# Altium integrated library Cap-Cer-SMD_V2.IntLib: 957 symbols (part 6 of 7)
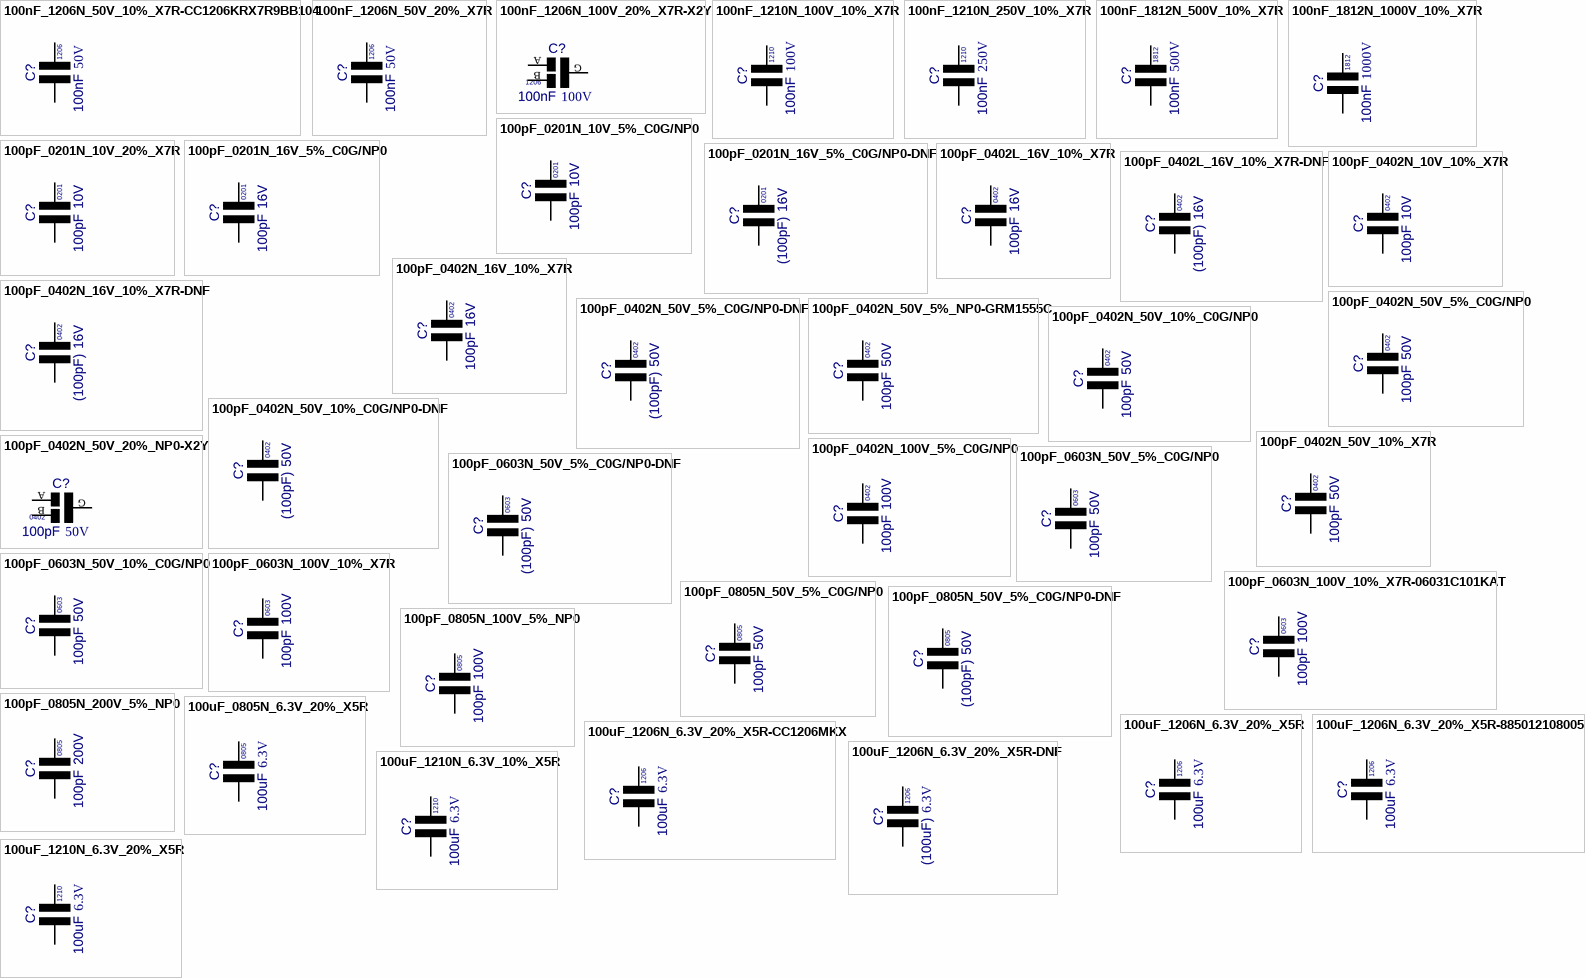
[diagram p28: symbols 100nF_1206N_50V_10%_X7R-CC1206KRX7R9BB104 to 100uF_1210N_6.3V_20%_X5R]

## 100pF_0603N_50V_5%_C0G/NP0-DNF
designator C?, comment value (100pF)  Voltage: 50V  Text1: 0603  (hidden comment: 100pF_C0603_50V_5%_C0G/NP0-DNF)
Cap Ceramic C0G/NP0 - Do not Fit; Manufacturer: Various; Part Number: DNF - 100pF 0603 50V 5% C0G/NP0; Tol: 5%; Package: CAPC0603X85N; EDM-PN: *; Text2: *; SAAB PN: *; DCE Part No: *
footprint CAPC0603X85N (Chip Capacitor, 0603, 2-Leads, Body 1.6x0.8mm, IPC Medium Density)
pins: 1, 2

## 100pF_0603N_50V_10%_C0G/NP0
designator C?, comment value 100pF  Voltage: 50V  Text1: 0603  (hidden comment: 100pF_C0603_50V_10%_C0G/NP0)
Cap Ceramic C0G/NP0; Manufacturer: Various; Part Number: 100pF 0603 50V 10% C0G/NP0; Tol: 10%; Reutech PN: 5910-CA-0418; Package: CAPC0603X85N; EDM-PN: *; Text2: *; SAAB PN: *; DCE Part No: *
footprint CAPC0603X85N (Chip Capacitor, 0603, 2-Leads, Body 1.6x0.8mm, IPC Medium Density)
pins: 1, 2

## 100pF_0603N_100V_10%_X7R
designator C?  value 100pF  Voltage: 100V  Text1: 0603  (hidden comment: 100pF_0603N_100V_10%_X7R)
Cap Ceramic X7R; Manufacturer: Various; Part Number: 100pF 0603 100V 10% X7R; Tol: 10%; Package: CAPC0603X85N; EDM-PN: *; Text2: *; Reutech PN: *; SAAB PN: *; DCE Part No: *
footprint CAPC0603X85N (Chip Capacitor, 0603, 2-Leads, Body 1.6x0.8mm, IPC Medium Density)
pins: 1, 2

## 100pF_0603N_100V_10%_X7R-06031C101KAT
designator C?, comment value 100pF  Voltage: 100V  Text1: 0603  (hidden comment: 06031C101KAT)
Cap Ceramic X7R; Manufacturer: AVX; Tol: 10%; Part Number: 06031C101KAT; Package: CAPC0603X85N; EDM-PN: *; Text2: *; Reutech PN: *; SAAB PN: *; DCE Part No: *
footprint CAPC0603X85N (Chip Capacitor, 0603, 2-Leads, Body 1.6x0.8mm, IPC Medium Density)
pins: 1, 2

## 100pF_0805N_50V_5%_C0G/NP0
designator C?, comment value 100pF  Voltage: 50V  Text1: 0805  (hidden comment: 100pF_C0805_50V_5%_C0G/NP0)
Cap Ceramic C0G/NP0; Manufacturer: Various; Part Number: 100pF 0805 50V 5% C0G/NP0; Tol: 5%; Package: CAPC0805X110N; EDM-PN: *; Text2: *; SAAB PN: *; DCE Part No: *
footprint CAPC0805X110N (Chip Capacitor, 0805, 2-Leads, Body 2.0x1.3mm, IPC Medium Density)
pins: 1, 2

## 100pF_0805N_50V_5%_C0G/NP0-DNF
designator C?, comment value (100pF)  Voltage: 50V  Text1: 0805  (hidden comment: 100pF_C0805_50V_5%_C0G/NP0)
Cap Ceramic C0G/NP0 - Do not Fit; Manufacturer: Various; Part Number: DNF - 100pF 0805 50V 5% C0G/NP0; Tol: 5%; Package: CAPC0805X110N; EDM-PN: *; Text2: *; SAAB PN: *; DCE Part No: *
footprint CAPC0805X110N (Chip Capacitor, 0805, 2-Leads, Body 2.0x1.3mm, IPC Medium Density)
pins: 1, 2

## 100pF_0805N_100V_5%_NP0
designator C?, comment value 100pF  Voltage: 100V  Text1: 0805  (hidden comment: 100pF_C0805_100V_5%_NP0)
Cap Ceramic NP0; Manufacturer: Various; Part Number: 100pF 0805 100V 5% NP0; Tol: 5%; Reutech PN: 5910-CA-0161; Package: CAPC0805X110N; EDM-PN: *; Text2: *; SAAB PN: *; DCE Part No: *
footprint CAPC0805X110N (Chip Capacitor, 0805, 2-Leads, Body 2.0x1.3mm, IPC Medium Density)
pins: 1, 2

## 100pF_0805N_200V_5%_NP0
designator C?, comment value 100pF  Voltage: 200V  Text1: 0805  (hidden comment: 100pF_C0805_200V_5%_NP0)
Cap Ceramic NP0; Manufacturer: Various; Part Number: 100pF 0805 200V 5% C0G/NP0; Tol: 5%; Package: CAPC0805X110N; EDM-PN: *; Text2: *; SAAB PN: *; DCE Part No: *
footprint CAPC0805X110N (Chip Capacitor, 0805, 2-Leads, Body 2.0x1.3mm, IPC Medium Density)
pins: 1, 2

## 100uF_0805N_6.3V_20%_X5R
designator C?, comment value 100uF  Voltage: 6.3V  Text1: 0805  (hidden comment: 100uF_C0805_6.3V_20%_X5R)
Cap Ceramic X5R; Manufacturer: Various; Part Number: 100uF 0805 6.3V 20% X5R; Tol: 20%; Package: CAPC0805X135N; EDM-PN: *; Text2: *; SAAB PN: *; DCE Part No: *
footprint CAPC0805X135N (Chip Capacitor, 0805, 2-Leads, Body 2.0x1.3mm, IPC Medium Density)
pins: 1, 2

## 100uF_1206N_6.3V_20%_X5R
designator C?, comment value 100uF  Voltage: 6.3V  Text1: 1206  (hidden comment: 100uF_C1206_6.3V_20%_X5R)
Cap Ceramic X5R; Manufacturer: Various; Part Number: 100uF 1206 6.3V 20% X5R; Tol: 20%; Package: CAPC1206X135N; EDM-PN: *; Text2: *; SAAB PN: *; DCE Part No: *
footprint CAPC1206X135N (Chip Capacitor, 1206, 2-Leads, Body 3.2x1.6mm, IPC Medium Density)
pins: 1, 2

## 100uF_1206N_6.3V_20%_X5R-885012108005
designator C?, comment value 100uF  Voltage: 6.3V  Text1: 1206  (hidden comment: 885012108005)
Cap Ceramic X5R; Manufacturer: Wurth; EDM-PN: CAP1493; Tol: 20%; Part Number: 885012108005; Package: CAPC1206X135N; Text2: *; SAAB PN: *; DCE Part No: *
footprint CAPC1206X135N (Chip Capacitor, 1206, 2-Leads, Body 3.2x1.6mm, IPC Medium Density)
pins: 1, 2

## 100uF_1206N_6.3V_20%_X5R-CC1206MKX
designator C?, comment value 100uF  Voltage: 6.3V  Text1: 1206  (hidden comment: CC1206MKX5R5BB107)
Cap Ceramic X5R; Manufacturer: Yageo; EDM-PN: CAP615; Tol: 20%; Part Number: CC1206MKX5R5BB107; Package: CAPC1206X135N; Text2: *; SAAB PN: *; DCE Part No: *
footprint CAPC1206X135N (Chip Capacitor, 1206, 2-Leads, Body 3.2x1.6mm, IPC Medium Density)
pins: 1, 2

## 100uF_1206N_6.3V_20%_X5R-DNF
designator C?, comment value (100uF)  Voltage: 6.3V  Text1: 1206  (hidden comment: 100uF_C1206_6.3V_20%_X5R)
Cap Ceramic X5R - Do not Fit; Manufacturer: Various; Part Number: DNF - 100uF 1206 6.3V 20% X5R; Tol: 20%; Package: CAPC1206X135N; EDM-PN: *; Text2: *; SAAB PN: *; DCE Part No: *
footprint CAPC1206X135N (Chip Capacitor, 1206, 2-Leads, Body 3.2x1.6mm, IPC Medium Density)
pins: 1, 2

## 100uF_1210N_6.3V_10%_X5R
designator C?, comment value 100uF  Voltage: 6.3V  Text1: 1210  (hidden comment: 100uF_C1210_6.3V_10%_X5R)
Cap Ceramic X5R; Manufacturer: Various; Part Number: 100uF 1210 6.3V 10% X5R; Tol: 10%; Package: CAPC1210X135N; EDM-PN: *; Text2: *; SAAB PN: *; DCE Part No: *
footprint CAPC1210X135N (Chip Capacitor, 1210, 2-Leads, Body 3.2x2.5mm, IPC Medium Density)
pins: 1, 2

## 100uF_1210N_6.3V_20%_X5R
designator C?, comment value 100uF  Voltage: 6.3V  Text1: 1210  (hidden comment: 100uF_C1210_6.3V_20%_X5R)
Cap Ceramic X5R; Manufacturer: Various; Part Number: 100uF 1210 6.3V 20% X5R; DCE Part No: 9196; Tol: 20%; Package: CAPC1210X135N; EDM-PN: *; Text2: *; SAAB PN: *
footprint CAPC1210X135N (Chip Capacitor, 1210, 2-Leads, Body 3.2x2.5mm, IPC Medium Density)
pins: 1, 2

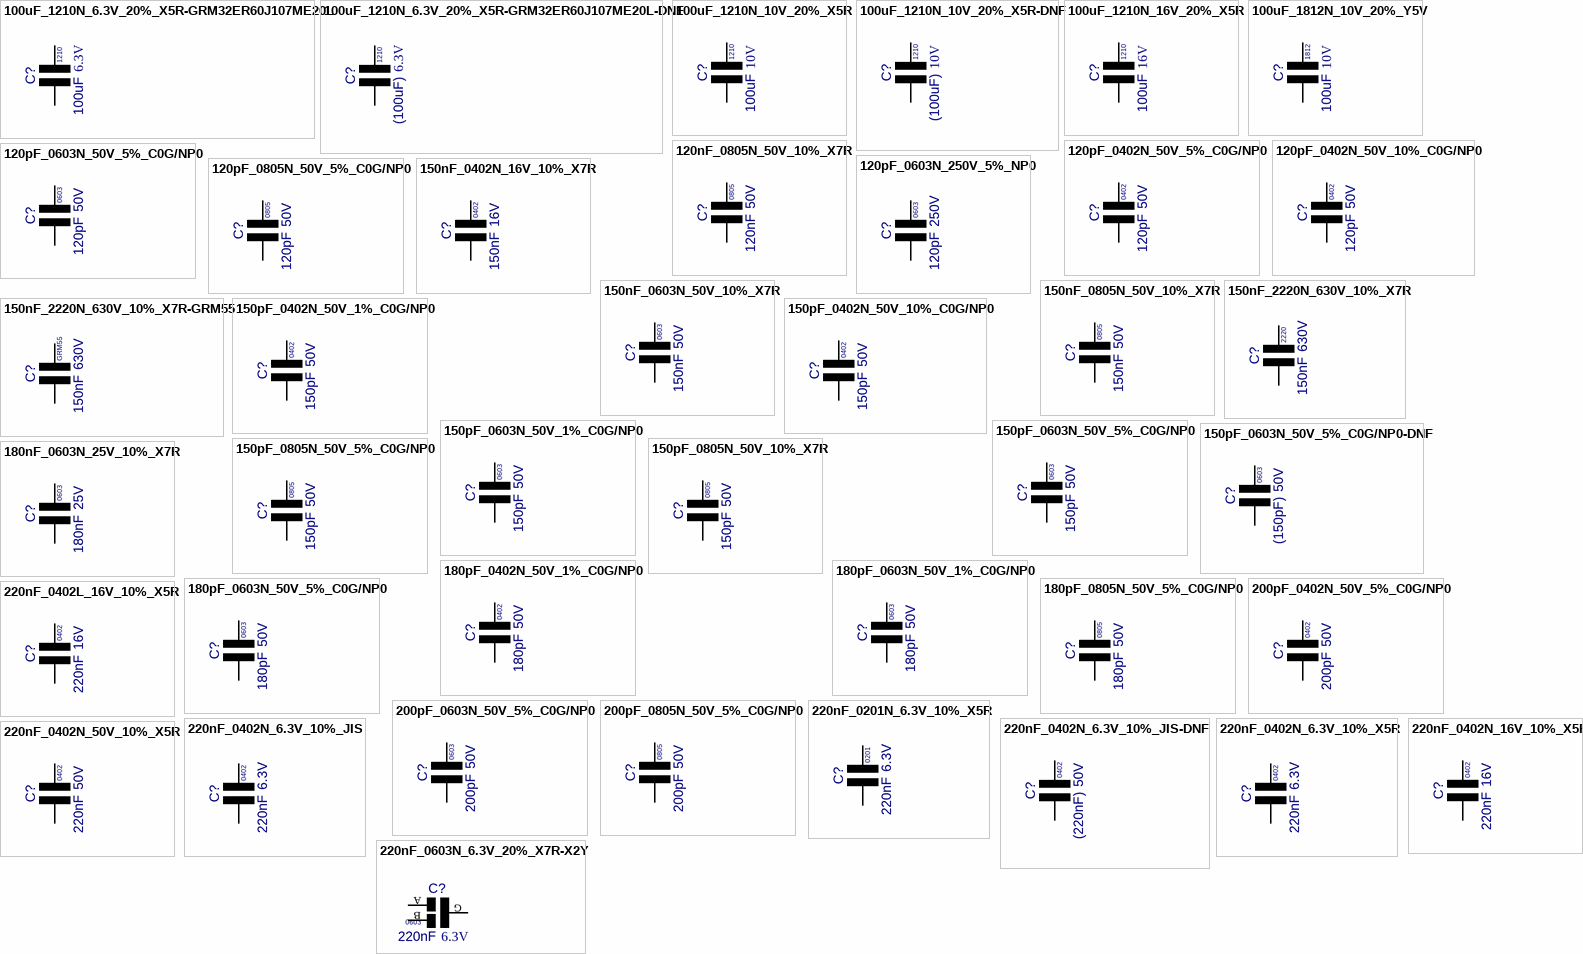
[diagram p19: symbols 100uF_1210N_6.3V_20%_X5R-GRM32ER60J107ME20L to 220nF_0603N_6.3V_20%_X7R-X2Y]

## 100uF_1210N_6.3V_20%_X5R-GRM32ER60J107ME20L
designator C?, comment value 100uF  Voltage: 6.3V  Text1: 1210  (hidden comment: GRM32ER60J107ME20L)
Cap Ceramic X5R; Manufacturer: Murata; Tol: 20%; Part Number: GRM32ER60J107ME20L; Package: CAPC1210X135N; EDM-PN: *; Text2: *; SAAB PN: *; DCE Part No: *
footprint CAPC1210X135N (Chip Capacitor, 1210, 2-Leads, Body 3.2x2.5mm, IPC Medium Density)
pins: 1, 2

## 100uF_1210N_6.3V_20%_X5R-GRM32ER60J107ME20L-DNF
designator C?, comment value (100uF)  Voltage: 6.3V  Text1: 1210  (hidden comment: GRM32ER60J107ME20L)
Cap Ceramic X5R - Do not Fit; Manufacturer: Murata; Part Number: DNF - GRM32ER60J107ME20L; Tol: 20%; Package: CAPC1210X135N; EDM-PN: *; Text2: *; SAAB PN: *; DCE Part No: *
footprint CAPC1210X135N (Chip Capacitor, 1210, 2-Leads, Body 3.2x2.5mm, IPC Medium Density)
pins: 1, 2

## 100uF_1210N_10V_20%_X5R
designator C?, comment value 100uF  Voltage: 10V  Text1: 1210  (hidden comment: 100uF_C1210_10V_20%_X5R)
Cap Ceramic X5R; Manufacturer: Various; Part Number: 100uF 1210 10V 20% X5R; EDM-PN: CAP614; Tol: 20%; Package: CAPC1210X135N; Text2: *; SAAB PN: *; DCE Part No: *
footprint CAPC1210X135N (Chip Capacitor, 1210, 2-Leads, Body 3.2x2.5mm, IPC Medium Density)
pins: 1, 2

## 100uF_1210N_10V_20%_X5R-DNF
designator C?, comment value (100uF)  Voltage: 10V  Text1: 1210  (hidden comment: 100uF_C1210_10V_20%_X5R)
Cap Ceramic X5R - Do not Fit; Manufacturer: Various; Part Number: DNF - 100uF 1210 10V 20% X5R; EDM-PN: CAP614; Tol: 20%; Package: CAPC1210X135N; Text2: *; SAAB PN: *; DCE Part No: *
footprint CAPC1210X135N (Chip Capacitor, 1210, 2-Leads, Body 3.2x2.5mm, IPC Medium Density)
pins: 1, 2

## 100uF_1210N_16V_20%_X5R
designator C?, comment value 100uF  Voltage: 16V  Text1: 1210  (hidden comment: 100uF_C1210_16V_20%_X5R)
Cap Ceramic X5R; Manufacturer: Various; Part Number: 100uF 1210 16V 20% X5R; EDM-PN: CAP676; Tol: 20%; Package: CAPC1210X135N; Text2: *; SAAB PN: *; DCE Part No: *
footprint CAPC1210X135N (Chip Capacitor, 1210, 2-Leads, Body 3.2x2.5mm, IPC Medium Density)
pins: 1, 2

## 100uF_1812N_10V_20%_Y5V
designator C?, comment value 100uF  Voltage: 10V  Text1: 1812  (hidden comment: 100uF_C1812_10V_20%_Y5V)
Cap Ceramic Y5V; Manufacturer: Various; Part Number: 100uF C1812 10V 20% Y5V; Tol: 20%; Package: CAPC1812X135N; EDM-PN: *; Text2: *; SAAB PN: *; DCE Part No: *
footprint CAPC1812X135N (Chip Capacitor, 1812, 2-Leads, Body 4.5x3.2mm, IPC Medium Density)
pins: 1, 2

## 120nF_0805N_50V_10%_X7R
designator C?, comment value 120nF  Voltage: 50V  Text1: 0805  (hidden comment: 120nF_C0805_50V_10%_X7R)
Cap Ceramic X7R; Manufacturer: Various; Part Number: 120nF 0805 50V 10% X7R; Tol: 10%; Package: CAPC0805X110N; EDM-PN: *; Text2: *; SAAB PN: *; DCE Part No: *
footprint CAPC0805X110N (Chip Capacitor, 0805, 2-Leads, Body 2.0x1.3mm, IPC Medium Density)
pins: 1, 2

## 120pF_0402N_50V_5%_C0G/NP0
designator C?, comment value 120pF  Voltage: 50V  Text1: 0402  (hidden comment: 120pF_C0402_50V_5%_C0G/NP0)
Cap Ceramic C0G/NP0; Manufacturer: Various; Part Number: 120pF 0402 50V 5% C0G/NP0; Tol: 5%; Package: CAPC0402X60N; EDM-PN: *; Text2: *; SAAB PN: *; DCE Part No: *
footprint CAPC0402X60N (Chip Capacitor, 0402, 2-Leads, Body 1.0x0.5mm, IPC Medium Density)
pins: 1, 2

## 120pF_0402N_50V_10%_C0G/NP0
designator C?, comment value 120pF  Voltage: 50V  Text1: 0402  (hidden comment: 120pF_C0402_50V_10%_C0G/NP0)
Cap Ceramic C0G/NP0; Manufacturer: Various; Part Number: 120pF 0402 50V 10% C0G/NP0; EDM-PN: CAP1330; Tol: 10%; Package: CAPC0402X60N; Text2: *; SAAB PN: *; DCE Part No: *
footprint CAPC0402X60N (Chip Capacitor, 0402, 2-Leads, Body 1.0x0.5mm, IPC Medium Density)
pins: 1, 2

## 120pF_0603N_50V_5%_C0G/NP0
designator C?, comment value 120pF  Voltage: 50V  Text1: 0603  (hidden comment: 120pF_C0603_50V_5%_C0G/NP0)
Cap Ceramic NP0; Manufacturer: Various; Part Number: 120pF 0603 50V 5% C0G/NP0; EDM-PN: CAP596; Tol: 5%; Package: CAPC0603X85N; Text2: *; SAAB PN: *; DCE Part No: *
footprint CAPC0603X85N (Chip Capacitor, 0603, 2-Leads, Body 1.6x0.8mm, IPC Medium Density)
pins: 1, 2

## 120pF_0603N_250V_5%_NP0
designator C?, comment value 120pF  Voltage: 250V  Text1: 0603  (hidden comment: 120pF_C0603_250V_5%_NP0)
Cap Ceramic NP0; Manufacturer: Various; Part Number: 120pF 0603 50V 5% C0G/NP0; Tol: 5%; Package: CAPC0603X85N; EDM-PN: *; Text2: *; SAAB PN: *; DCE Part No: *
footprint CAPC0603X85N (Chip Capacitor, 0603, 2-Leads, Body 1.6x0.8mm, IPC Medium Density)
pins: 1, 2

## 120pF_0805N_50V_5%_C0G/NP0
designator C?, comment value 120pF  Voltage: 50V  Text1: 0805  (hidden comment: 120pF_C0805_50V_5%_C0G/NP0)
Cap Ceramic C0G/NP0; Manufacturer: Various; Part Number: 120pF 0805 50V 5% C0G/NP0; Tol: 5%; Package: CAPC0805X110N; EDM-PN: *; Text2: *; SAAB PN: *; DCE Part No: *
footprint CAPC0805X110N (Chip Capacitor, 0805, 2-Leads, Body 2.0x1.3mm, IPC Medium Density)
pins: 1, 2

## 150nF_0402N_16V_10%_X7R
designator C?, comment value 150nF  Voltage: 16V  Text1: 0402  (hidden comment: 150nF_C0402_16V_10%_X7R)
Cap Ceramic X7R; Manufacturer: Various; Part Number: 150nF 0402 16V 10% X7R; EDM-PN: CAP1034; Tol: 10%; Package: CAPC0402X60N; Text2: *; Reutech PN: *; SAAB PN: *; DCE Part No: *
footprint CAPC0402X60N (Chip Capacitor, 0402, 2-Leads, Body 1.0x0.5mm, IPC Medium Density)
pins: 1, 2

## 150nF_0603N_50V_10%_X7R
designator C?, comment value 150nF  Voltage: 50V  Text1: 0603  (hidden comment: 150nF_C0603_50V_10%_X7R)
Cap Ceramic X7R; Manufacturer: Various; Part Number: 150nF 0603 50V 10% X7R; Tol: 10%; Package: CAPC0603X85N; EDM-PN: *; Text2: *; SAAB PN: *; DCE Part No: *
footprint CAPC0603X85N (Chip Capacitor, 0603, 2-Leads, Body 1.6x0.8mm, IPC Medium Density)
pins: 1, 2

## 150nF_0805N_50V_10%_X7R
designator C?, comment value 150nF  Voltage: 50V  Text1: 0805  (hidden comment: 150nF_C0805_50V_10%_X7R)
Cap Ceramic X7R; Manufacturer: Various; Part Number: 150nF 0805 50V 10% X7R; Tol: 10%; Package: CAPC0805X110N; EDM-PN: *; Text2: *; SAAB PN: *; DCE Part No: *
footprint CAPC0805X110N (Chip Capacitor, 0805, 2-Leads, Body 2.0x1.3mm, IPC Medium Density)
pins: 1, 2

## 150nF_2220N_630V_10%_X7R
designator C?, comment value 150nF  Voltage: 630V  Text1: 2220  (hidden comment: 150nF_C2220_630V_10%_X7R)
Cap Ceramic X7R; Manufacturer: Various; Part Number: 150nF 0805 50V 10% X7R; Tol: 10%; Package: C2220; EDM-PN: *; Text2: *; SAAB PN: *; DCE Part No: *
footprint CAPC2220x220 (Chip Capacitor, 2220, 2-Leads, Body 5.6x5.0mm)
pins: 1, 2

## 150nF_2220N_630V_10%_X7R-GRM55
designator C?, comment value 150nF  Voltage: 630V  Text1: GRM55  (hidden comment: GRM55DR72J154KW01L)
Cap Ceramic X7R; Manufacturer: Murata; Tol: 10%; Part Number: GRM55DR72J154KW01L; Package: C2220; EDM-PN: *; Text2: *; SAAB PN: *; DCE Part No: *
footprint CAPC2220x220 (Chip Capacitor, 2220, 2-Leads, Body 5.6x5.0mm)
pins: 1, 2

## 150pF_0402N_50V_1%_C0G/NP0
designator C?, comment value 150pF  Voltage: 50V  Text1: 0402  (hidden comment: 150pF_C0402_50V_1%_C0G/NP0)
Cap Ceramic C0G/NP0; Manufacturer: Various; Part Number: 150pF 0402 50V 1% C0G/NP0; Tol: 1%; Package: CAPC0402X60N; EDM-PN: *; Text2: *; SAAB PN: *; DCE Part No: *
footprint CAPC0402X60N (Chip Capacitor, 0402, 2-Leads, Body 1.0x0.5mm, IPC Medium Density)
pins: 1, 2

## 150pF_0402N_50V_10%_C0G/NP0
designator C?, comment value 150pF  Voltage: 50V  Text1: 0402  (hidden comment: 150pF_C0402_50V_10%_C0G/NP0)
Cap Ceramic C0G/NP0; Manufacturer: Various; Part Number: 150pF 0402 50V 10% C0G/NP0; DCE Part No: 7136; Tol: 10%; Package: CAPC0402X60N; EDM-PN: *; Text2: *; SAAB PN: *
footprint CAPC0402X60N (Chip Capacitor, 0402, 2-Leads, Body 1.0x0.5mm, IPC Medium Density)
pins: 1, 2

## 150pF_0603N_50V_1%_C0G/NP0
designator C?, comment value 150pF  Voltage: 50V  Text1: 0603  (hidden comment: 150pF_C0603_50V_1%_C0G/NP0)
Cap Ceramic C0G/NP0; Manufacturer: Various; Part Number: 150pF 0603 50V 1% C0G/NP0; EDM-PN: CAP683; Tol: 1%; Package: CAPC0603X85N; Text2: *; SAAB PN: *; DCE Part No: *
footprint CAPC0603X85N (Chip Capacitor, 0603, 2-Leads, Body 1.6x0.8mm, IPC Medium Density)
pins: 1, 2

## 150pF_0603N_50V_5%_C0G/NP0
designator C?, comment value 150pF  Voltage: 50V  Text1: 0603  (hidden comment: 150pF_C0603_50V_5%_C0G/NP0)
Cap Ceramic C0G/NP0; Manufacturer: Various; Part Number: 150pF 0603 50V 5% C0G/NP0; Tol: 5%; Package: CAPC0603X85N; EDM-PN: *; Text2: *; SAAB PN: *; DCE Part No: *
footprint CAPC0603X85N (Chip Capacitor, 0603, 2-Leads, Body 1.6x0.8mm, IPC Medium Density)
pins: 1, 2

## 150pF_0603N_50V_5%_C0G/NP0-DNF
designator C?, comment value (150pF)  Voltage: 50V  Text1: 0603  (hidden comment: 150pF_C0603_50V_5%_C0G/NP0)
Cap Ceramic C0G/NP0 - Do not Fit; Manufacturer: Various; Part Number: DNF - 150pF 0603 50V 5% C0G/NP0; Tol: 5%; Package: CAPC0603X85N; EDM-PN: *; Text2: *; SAAB PN: *; DCE Part No: *
footprint CAPC0603X85N (Chip Capacitor, 0603, 2-Leads, Body 1.6x0.8mm, IPC Medium Density)
pins: 1, 2

## 150pF_0805N_50V_5%_C0G/NP0
designator C?, comment value 150pF  Voltage: 50V  Text1: 0805  (hidden comment: 150pF_C0805_50V_5%_C0G/NP0)
Cap Ceramic C0G/NP0; Manufacturer: Various; Part Number: 150pF 0805 50V 5% C0G/NP0; Tol: 5%; Package: CAPC0805X110N; EDM-PN: *; Text2: *; SAAB PN: *; DCE Part No: *
footprint CAPC0805X110N (Chip Capacitor, 0805, 2-Leads, Body 2.0x1.3mm, IPC Medium Density)
pins: 1, 2

## 150pF_0805N_50V_10%_X7R
designator C?, comment value 150pF  Voltage: 50V  Text1: 0805  (hidden comment: 150pF_C0805_50V_10%_X7R)
Cap Ceramic X7R; Manufacturer: Various; Part Number: 150pF 0805 50V 10% X7R; Tol: 10%; Reutech PN: 5910-CA-0099; Package: CAPC0805X110N; EDM-PN: *; Text2: *; SAAB PN: *; DCE Part No: *
footprint CAPC0805X110N (Chip Capacitor, 0805, 2-Leads, Body 2.0x1.3mm, IPC Medium Density)
pins: 1, 2

## 180nF_0603N_25V_10%_X7R
designator C?, comment value 180nF  Voltage: 25V  Text1: 0603  (hidden comment: 180nF_C0603_25V_10%_X7R)
Cap Ceramic X7R; Manufacturer: Various; Part Number: 180nF 0603 25V 10% X7R; Tol: 10%; Package: CAPC0603X85N; EDM-PN: *; Text2: *; SAAB PN: *; DCE Part No: *
footprint CAPC0603X85N (Chip Capacitor, 0603, 2-Leads, Body 1.6x0.8mm, IPC Medium Density)
pins: 1, 2

## 180pF_0402N_50V_1%_C0G/NP0
designator C?, comment value 180pF  Voltage: 50V  Text1: 0402  (hidden comment: 180pF_C0402_50V_1%_C0G/NP0)
Cap Ceramic C0G/NP0; Manufacturer: Various; Part Number: 180pF 0402 50V 1% C0G/NP0; Tol: 1%; Package: CAPC0402X60N; EDM-PN: *; Text2: *; SAAB PN: *; DCE Part No: *
footprint CAPC0402X60N (Chip Capacitor, 0402, 2-Leads, Body 1.0x0.5mm, IPC Medium Density)
pins: 1, 2

## 180pF_0603N_50V_1%_C0G/NP0
designator C?, comment value 180pF  Voltage: 50V  Text1: 0603  (hidden comment: 180pF_C0603_50V_1%_C0G/NP0)
Cap Ceramic C0G/NP0; Manufacturer: Various; Part Number: 180pF 0603 50V 1% C0G/NP0; Tol: 1%; Package: CAPC0603X85N; EDM-PN: *; Text2: *; SAAB PN: *; DCE Part No: *
footprint CAPC0603X85N (Chip Capacitor, 0603, 2-Leads, Body 1.6x0.8mm, IPC Medium Density)
pins: 1, 2

## 180pF_0603N_50V_5%_C0G/NP0
designator C?, comment value 180pF  Voltage: 50V  Text1: 0603  (hidden comment: 180pF_C0603_50V_5%_C0G/NP0)
Cap Ceramic C0G/NP0; Manufacturer: Various; Part Number: 180pF 0603 50V 5% C0G/NP0; Tol: 5%; Package: CAPC0603X85N; EDM-PN: *; Text2: *; SAAB PN: *; DCE Part No: *
footprint CAPC0603X85N (Chip Capacitor, 0603, 2-Leads, Body 1.6x0.8mm, IPC Medium Density)
pins: 1, 2

## 180pF_0805N_50V_5%_C0G/NP0
designator C?, comment value 180pF  Voltage: 50V  Text1: 0805  (hidden comment: 180pF_C0805_50V_5%_C0G/NP0)
Cap Ceramic C0G/NP0; Manufacturer: Various; Part Number: 180pF 0805 50V 5% C0G/NP0; Tol: 5%; Package: CAPC0805X110N; EDM-PN: *; Text2: *; SAAB PN: *; DCE Part No: *
footprint CAPC0805X110N (Chip Capacitor, 0805, 2-Leads, Body 2.0x1.3mm, IPC Medium Density)
pins: 1, 2

## 200pF_0402N_50V_5%_C0G/NP0
designator C?, comment value 200pF  Voltage: 50V  Text1: 0402  (hidden comment: 200pF_C0402_50V_5%_C0G/NP0)
Cap Ceramic C0G/NP0; Manufacturer: Various; Part Number: 200pF 0402 50V 5% C0G/NP0; Tol: 5%; Package: CAPC0402X60N; EDM-PN: *; Text2: *; SAAB PN: *; DCE Part No: *
footprint CAPC0402X60N (Chip Capacitor, 0402, 2-Leads, Body 1.0x0.5mm, IPC Medium Density)
pins: 1, 2

## 200pF_0603N_50V_5%_C0G/NP0
designator C?, comment value 200pF  Voltage: 50V  Text1: 0603  (hidden comment: 200pF_C0603_50V_5%_C0G/NP0)
Cap Ceramic C0G/NP0; Manufacturer: Various; Part Number: 200pF 0603 50V 5% C0G/NP0; Tol: 5%; Package: CAPC0603X85N; EDM-PN: *; Text2: *; SAAB PN: *; DCE Part No: *
footprint CAPC0603X85N (Chip Capacitor, 0603, 2-Leads, Body 1.6x0.8mm, IPC Medium Density)
pins: 1, 2

## 200pF_0805N_50V_5%_C0G/NP0
designator C?, comment value 200pF  Voltage: 50V  Text1: 0805  (hidden comment: 200pF_C0805_50V_5%_C0G/NP0)
Cap Ceramic C0G/NP0; Manufacturer: Various; Part Number: 200pF 0805 50V 5% C0G/NP0; Tol: 5%; Package: CAPC0805X110N; EDM-PN: *; Text2: *; SAAB PN: *; DCE Part No: *
footprint CAPC0805X110N (Chip Capacitor, 0805, 2-Leads, Body 2.0x1.3mm, IPC Medium Density)
pins: 1, 2

## 220nF_0201N_6.3V_10%_X5R
designator C?  value 220nF  Voltage: 6.3V  Text1: 0201  (hidden comment: 220nF_0201N_6.3V_10%_X5R)
Cap Ceramic X5R; Manufacturer: Various; Part Number: 220nF 0201 6.3V 10% X5R; Tol: 10%; Package: CAPC0201X33N; EDM-PN: *; Text2: *; SAAB PN: *; DCE Part No: *
footprint CAPC0201X33N (Chip Capacitor, 0201, 2-Leads, Body 0.6x0.3mm, IPC Medium Density)
pins: 1, 2

## 220nF_0402L_16V_10%_X5R
designator C?, comment value 220nF  Voltage: 16V  Text1: 0402  (hidden comment: 220nF_C0402_16V_10%_X5R)
Cap Ceramic X5R; Manufacturer: Various; Part Number: 220nF C0402 16V 10% X5R; Tol: 10%; Package: CAPC0402X60L; EDM-PN: *; Text2: *; SAAB PN: *; DCE Part No: *
footprint CAPC0402X60L (Chip Capacitor, 0402, 2-Leads, Body 1.0x0.5mm, IPC High Density)
pins: 1, 2

## 220nF_0402N_6.3V_10%_JIS
designator C?, comment value 220nF  Voltage: 6.3V  Text1: 0402  (hidden comment: 220nF_C0402_6.3V_10%_JIS)
Cap Ceramic B (JIS); Manufacturer: Murata; Part Number: GRM155B10J224KE01B; Tol: 10%; Package: CAPC0402X60N; EDM-PN: *; Text2: *; SAAB PN: *; DCE Part No: *
footprint CAPC0402X60N (Chip Capacitor, 0402, 2-Leads, Body 1.0x0.5mm, IPC Medium Density)
pins: 1, 2

## 220nF_0402N_6.3V_10%_JIS-DNF
designator C?, comment value (220nF)  Voltage: 50V  Text1: 0402  (hidden comment: 220nF_C0402_6.3V_10%_JIS-DNF)
Cap Ceramic B (JIS) - Do not Fit; Manufacturer: Murata; Part Number: DNF - GRM155B10J224KE01B; Tol: 10%; Package: CAPC0402X60N; EDM-PN: *; Text2: *; SAAB PN: *; DCE Part No: *
footprint CAPC0402X60N (Chip Capacitor, 0402, 2-Leads, Body 1.0x0.5mm, IPC Medium Density)
pins: 1, 2

## 220nF_0402N_6.3V_10%_X5R
designator C?, comment value 220nF  Voltage: 6.3V  Text1: 0402  (hidden comment: 220nF_C0402_6.3V_10%_X5R)
Cap Ceramic X5R; Manufacturer: Various; Part Number: 220nF C0402 6.3V 10% X5R; EDM-PN: CAP1426; Tol: 10%; Package: CAPC0402X60N; Text2: *; SAAB PN: *; DCE Part No: *
footprint CAPC0402X60N (Chip Capacitor, 0402, 2-Leads, Body 1.0x0.5mm, IPC Medium Density)
pins: 1, 2

## 220nF_0402N_16V_10%_X5R
designator C?, comment value 220nF  Voltage: 16V  Text1: 0402  (hidden comment: 220nF_C0402_16V_10%_X5R)
Cap Ceramic X5R; Manufacturer: Various; Part Number: 220nF C0402 16V 10% X5R; Tol: 10%; Package: CAPC0402X60N; EDM-PN: *; Text2: *; SAAB PN: *; DCE Part No: *
footprint CAPC0402X60N (Chip Capacitor, 0402, 2-Leads, Body 1.0x0.5mm, IPC Medium Density)
pins: 1, 2

## 220nF_0402N_50V_10%_X5R
designator C?, comment value 220nF  Voltage: 50V  Text1: 0402  (hidden comment: 220nF_C0402_50V_10%_X5R)
Cap Ceramic X5R; Manufacturer: Various; Part Number: 220nF C0402 50V 10% X5R; EDM-PN: CAP1306; Tol: 10%; Package: CAPC0402X60N; Text2: *; SAAB PN: *; DCE Part No: *
footprint CAPC0402X60N (Chip Capacitor, 0402, 2-Leads, Body 1.0x0.5mm, IPC Medium Density)
pins: 1, 2

## 220nF_0603N_6.3V_20%_X7R-X2Y
designator C?, comment value 220nF  Voltage: 6.3V  Text1: 0603  (hidden comment: X2Y-220nF_C0603_6.3V_20%_X7R)
Cap Ceramic X2Y; Manufacturer: Johanson; Part Number: 6.3X14W224MV4T; Tol: 20%; Package: CAPC0603-X2Y; EDM-PN: *; Text2: *; SAAB PN: *; DCE Part No: *
footprint CAPC0603-X2Y (Cap 0603 X2Y 1.6x0.89mm)
pins: A, B, G

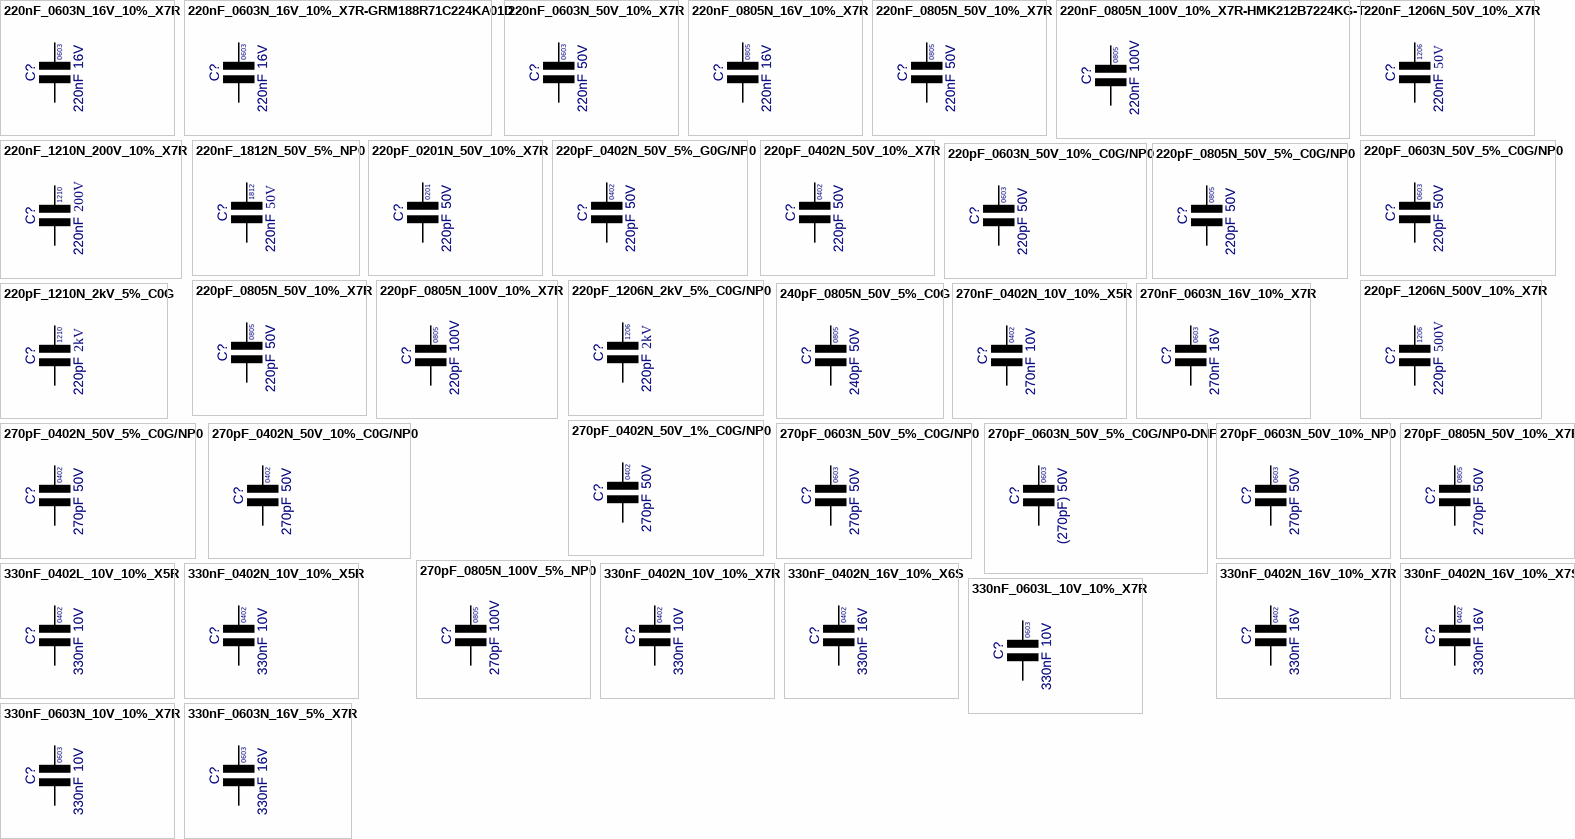
[diagram p20: symbols 220nF_0603N_16V_10%_X7R to 330nF_0603N_16V_5%_X7R]

## 220nF_0603N_16V_10%_X7R
designator C?, comment value 220nF  Voltage: 16V  Text1: 0603  (hidden comment: 220nF_C0603_16V_10%_X7R)
Cap Ceramic X7R; Manufacturer: Various; Part Number: 220nF 0603 16V 10% X7R; Tol: 10%; Package: CAPC0603X85N; EDM-PN: *; Text2: *; SAAB PN: *; DCE Part No: *
footprint CAPC0603X85N (Chip Capacitor, 0603, 2-Leads, Body 1.6x0.8mm, IPC Medium Density)
pins: 1, 2

## 220nF_0603N_16V_10%_X7R-GRM188R71C224KA01D
designator C?, comment value 220nF  Voltage: 16V  Text1: 0603  (hidden comment: GRM188R71C224KA01DX7R)
Cap Ceramic X7R; Manufacturer: Murata; Tol: 10%; Part Number: GRM188R71C224KA01D; Package: CAPC0603X85N; EDM-PN: *; Text2: *; SAAB PN: *; DCE Part No: *
footprint CAPC0603X85N (Chip Capacitor, 0603, 2-Leads, Body 1.6x0.8mm, IPC Medium Density)
pins: 1, 2

## 220nF_0603N_50V_10%_X7R
designator C?, comment value 220nF  Voltage: 50V  Text1: 0603  (hidden comment: 220nF_C0603_50V_10%_X7R)
Cap Ceramic X7R; Manufacturer: Various; Part Number: 220nF 0603 50V 10% X7R; EDM-PN: CAP272; Tol: 10%; Package: CAPC0603X85N; Text2: *; SAAB PN: *; DCE Part No: *
footprint CAPC0603X85N (Chip Capacitor, 0603, 2-Leads, Body 1.6x0.8mm, IPC Medium Density)
pins: 1, 2

## 220nF_0805N_16V_10%_X7R
designator C?, comment value 220nF  Voltage: 16V  Text1: 0805  (hidden comment: 220nF_C0805_16V_10%_X7R)
Cap Ceramic X7R; Manufacturer: Various; Part Number: 220nF 0805 16V 10% X7R; Tol: 10%; Package: CAPC0805X110N; EDM-PN: *; Text2: *; Reutech PN: *; SAAB PN: *; DCE Part No: *
footprint CAPC0805X110N (Chip Capacitor, 0805, 2-Leads, Body 2.0x1.3mm, IPC Medium Density)
pins: 1, 2

## 220nF_0805N_50V_10%_X7R
designator C?, comment value 220nF  Voltage: 50V  Text1: 0805  (hidden comment: 220nF_C0805_50V_10%_X7R)
Cap Ceramic X7R; Manufacturer: Various; Part Number: 220nF 0805 50V 10% X7R; EDM-PN: CAP291; Tol: 10%; Reutech PN: 5910-CA-0438; Package: CAPC0805X110N; Text2: *; SAAB PN: *; DCE Part No: *
footprint CAPC0805X110N (Chip Capacitor, 0805, 2-Leads, Body 2.0x1.3mm, IPC Medium Density)
pins: 1, 2

## 220nF_0805N_100V_10%_X7R-HMK212B7224KG-T
designator C?, comment value 220nF  Voltage: 100V  Text1: 0805  (hidden comment: 220nF_C0805_100V_10%_X7R)
Cap Ceramic X7R; Manufacturer: Taiyo Yuden; Part Number: HMK212B7224KG-T; EDM-PN: CAP291; Tol: 10%; Package: CAPC0805X110N; Text2: *; SAAB PN: *; DCE Part No: *
footprint CAPC0805X110N (Chip Capacitor, 0805, 2-Leads, Body 2.0x1.3mm, IPC Medium Density)
pins: 1, 2

## 220nF_1206N_50V_10%_X7R
designator C?, comment value 220nF  Voltage: 50V  Text1: 1206  (hidden comment: 220nF_C1206_50V_10%_X7R)
Cap Ceramic X7R; Manufacturer: Various; Part Number: 220nF 1206 50V 10% X7R; Tol: 10%; Package: CAPC1206X135N; EDM-PN: *; Text2: *; SAAB PN: *; DCE Part No: *
footprint CAPC1206X135N (Chip Capacitor, 1206, 2-Leads, Body 3.2x1.6mm, IPC Medium Density)
pins: 1, 2

## 220nF_1210N_200V_10%_X7R
designator C?, comment value 220nF  Voltage: 200V  Text1: 1210  (hidden comment: 220nF_C1210_200V_10%_X7R)
Cap Ceramic X7R; Manufacturer: Various; Part Number: 220nF 1210 200V 10% X7R; Tol: 10%; Package: CAPC1210X135N; EDM-PN: *; Text2: *; SAAB PN: *; DCE Part No: *
footprint CAPC1210X135N (Chip Capacitor, 1210, 2-Leads, Body 3.2x2.5mm, IPC Medium Density)
pins: 1, 2

## 220nF_1812N_50V_5%_NP0
designator C?, comment value 220nF  Voltage: 50V  Text1: 1812  (hidden comment: 220nF_C1812_50V_5%_NP0)
Cap Ceramic NP0; Manufacturer: Various; Part Number: 220nF 1812 50V 5% NP0; Tol: 5%; Package: CAPC1812X190N; EDM-PN: *; Text2: *; SAAB PN: *; DCE Part No: *
footprint CAPC1812X190N (Chip Capacitor, 1812, 2-Leads, Body 4.5x3.2mm, IPC Medium Density)
pins: 1, 2

## 220pF_0201N_50V_10%_X7R
designator C?  value 220pF  Voltage: 50V  Text1: 0201  (hidden comment: 220pF_0201N_50V_10%_X7R)
Cap Ceramic X7R; Manufacturer: Various; Part Number: 220pF 0201 50V 10% X7R; Tol: 10%; Package: CAPC0201X33N; EDM-PN: *; Text2: *; SAAB PN: *; DCE Part No: *
footprint CAPC0201X33N (Chip Capacitor, 0201, 2-Leads, Body 0.6x0.3mm, IPC Medium Density)
pins: 1, 2

## 220pF_0402N_50V_5%_G0G/NP0
designator C?, comment value 220pF  Voltage: 50V  Text1: 0402  (hidden comment: 220pF_C0402_50V_5%_G0G/NP0)
Cap Ceramic G0G/NP0; Manufacturer: Various; Part Number: 220pF 0402 50V 5% C0G/NP0; DCE Part No: 9244; EDM-PN: CAP524; Tol: 5%; Package: CAPC0402X60N; Text2: *; SAAB PN: *
footprint CAPC0402X60N (Chip Capacitor, 0402, 2-Leads, Body 1.0x0.5mm, IPC Medium Density)
pins: 1, 2

## 220pF_0402N_50V_10%_X7R
designator C?, comment value 220pF  Voltage: 50V  Text1: 0402  (hidden comment: 220pF_C0402_50V_10%_X7R)
Cap Ceramic X7R; Manufacturer: Various; Part Number: 220pF 0402 50V 10% X7R; Tol: 10%; Package: CAPC0402X60N; EDM-PN: *; Text2: *; SAAB PN: *; DCE Part No: *
footprint CAPC0402X60N (Chip Capacitor, 0402, 2-Leads, Body 1.0x0.5mm, IPC Medium Density)
pins: 1, 2

## 220pF_0603N_50V_5%_C0G/NP0
designator C?, comment value 220pF  Voltage: 50V  Text1: 0603  (hidden comment: 220pF_C0603_50V_5%_C0G/NP0)
Cap Ceramic C0G/NP0; Manufacturer: Various; Part Number: 220pF 0603 50V 5% C0G/NP0; EDM-PN: CAP435; Tol: 5%; Reutech PN: 5910-CA-0458; Package: CAPC0603X85N; Text2: *; SAAB PN: *; DCE Part No: *
footprint CAPC0603X85N (Chip Capacitor, 0603, 2-Leads, Body 1.6x0.8mm, IPC Medium Density)
pins: 1, 2
